# Altium footprint library 4.49-接插件.PcbLib: 260 footprints (part 17 of 17)
Each footprint in its own frame and in the unit in brackets; x right, y up, seen from the top. Pads: shape width x height; smd on the part's side, far side on the other; paste and mask are expansions set on the pad; w line width, h text height; cw(c..) or ccw(c..) is an arc to the next point about the centre after c.
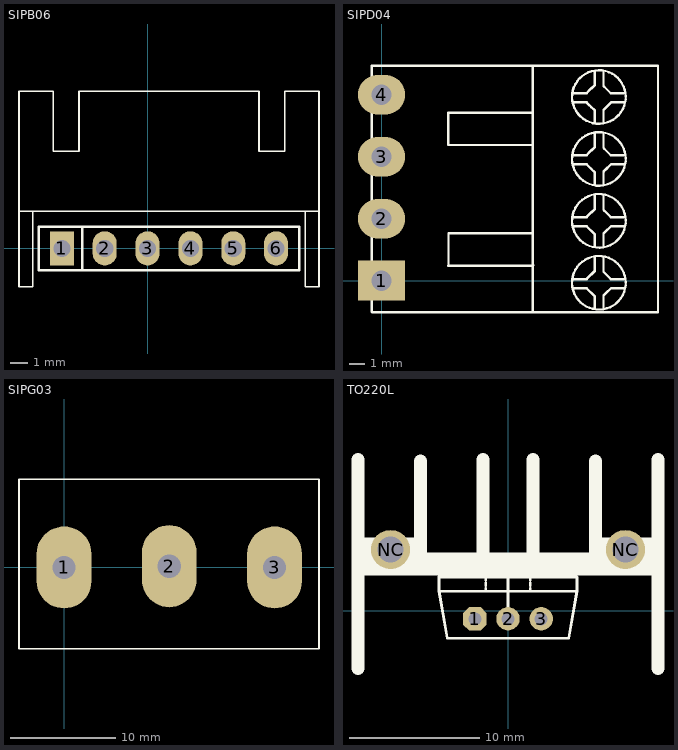
[diagram p16: the footprints below, top view; thin cyan lines are the x and y axes]

## SIPB06 [mm] "[ PCBѧϰȺ514746572 ]"
pads (6):
  rect 1.4x2 hole 1: 1(-5,0)
  oval 1.4x2 hole 1: 2(-2.5,0) 3(0,0) 4(2.5,0) 5(5,0) 6(7.5,0)
Top Overlay:
  lines w0.1: -4,9.164 -4,5.664 -5.5,5.664 -5.5,9.164 -7.5,9.164 -7.5,-2.236 -6.7,-2.236 -6.7,2.164 -7.5,2.164 1.62,2.164 4.27,2.164 ; -4,9.167 6.5,9.167 ; 4.16,2.164 6.81,2.164 ; 6.5,9.164 6.5,5.664 8,5.664 8,9.164 10,9.164 10,-2.236 9.2,-2.236 9.2,2.164 10,2.164 ; 6.66,2.164 9.31,2.164
  lines w0.15: -3.81,-1.27 -3.81,1.27 ; -6.35,-1.27 8.85,-1.27 8.85,1.27 -6.35,1.27 -6.35,-1.27

## SIPD04 [mm] "[ PCBѧϰȺ514746572 ]"
pads (4):
  rect 3x2.54 hole 1.3: 1(0,0)
  oval 3x2.54 hole 1.3: 2(0,3.95) 3(0,7.9) 4(0,11.85)
Top Overlay:
  lines w0.15: 9.613,8.65 4.253,8.65 4.253,10.712 4.249,10.716 9.637,10.716 ; 9.63,3.025 4.27,3.025 4.27,0.963 4.266,0.959 9.654,0.959 9.671,0.976 ; 9.654,-2.019 9.654,13.711 9.637,13.694 ; 9.654,10.699 9.637,10.716 ; 12.168,0.099 13.066,0.099 13.336,0.369 13.606,0.639 13.606,1.495 13.606,0.618 13.087,0.099 ; 12.168,4.049 13.066,4.049 13.336,4.319 13.606,4.589 13.606,5.445 13.606,4.568 13.087,4.049 ; 12.168,7.999 13.066,7.999 13.336,8.269 13.606,8.539 13.606,9.395 13.606,8.518 13.087,7.999 ; 12.168,11.949 13.066,11.949 13.336,12.219 13.606,12.489 13.606,13.345 13.606,12.468 13.087,11.949 ; 12.197,-0.481 13.08,-0.481 ; 12.197,3.469 13.08,3.469 ; 12.197,7.419 13.08,7.419 ; 12.197,11.369 13.08,11.369 ; 13.373,-0.774 13.606,-1.007 13.606,-1.768 ; 13.373,3.176 13.606,2.943 13.606,2.182 ; 13.373,7.126 13.606,6.893 13.606,6.132 ; 13.373,11.076 13.606,10.843 13.606,10.082 ; 13.38,-0.781 13.08,-0.481 ; 13.38,3.169 13.08,3.469 ; 13.38,7.119 13.08,7.419 ; 13.38,11.069 13.08,11.369 ; 13.552,-0.953 13.08,-0.481 ; 13.552,2.997 13.08,3.469 ; 13.552,6.947 13.08,7.419 ; 13.552,10.897 13.08,11.369 ; 14.152,-1.789 14.152,-0.96 14.402,-0.71 ; 14.152,-0.946 14.166,-0.946 14.631,-0.481 ; 14.152,1.461 14.152,0.571 14.206,0.517 ; 14.152,2.161 14.152,2.99 14.402,3.24 ; 14.152,3.004 14.166,3.004 14.631,3.469 ; 14.152,5.411 14.152,4.521 14.206,4.467 ; 14.152,6.111 14.152,6.94 14.402,7.19 ; 14.152,6.954 14.166,6.954 14.631,7.419 ; 14.152,9.361 14.152,8.471 14.206,8.417 ; 14.152,10.061 14.152,10.89 14.402,11.14 ; 14.152,10.904 14.166,10.904 14.631,11.369 ; 14.152,13.311 14.152,12.421 14.206,12.367 ; 14.348,-0.764 14.631,-0.481 ; 14.348,3.186 14.631,3.469 ; 14.348,7.136 14.631,7.419 ; 14.348,11.086 14.631,11.369 ; 15.406,0.099 14.624,0.099 ; 15.406,4.049 14.624,4.049 ; 15.406,7.999 14.624,7.999 ; 15.406,11.949 14.624,11.949 ; 15.515,-0.481 14.631,-0.481 ; 15.515,3.469 14.631,3.469 ; 15.515,7.419 14.631,7.419 ; 15.515,11.369 14.631,11.369 ; 15.565,-0.277 cw(c13.861,-0.136) 15.571,-0.136 ; 15.565,3.673 cw(c13.861,3.814) 15.571,3.814 ; 15.565,7.623 cw(c13.861,7.764) 15.571,7.764 ; 15.565,11.573 cw(c13.861,11.714) 15.571,11.714 ; 17.629,-2.019 13.222,-2.019 1.07,-2.019 -0.009,-2.019 -0.482,-2.019 -0.587,-2.019 -0.629,-1.977 -0.629,13.694 2.115,13.694 9.637,13.694 ; 17.632,-2.022 17.632,13.694 9.637,13.694 ; 9.637,10.716 9.637,13.694 ; 14.206,0.517 14.624,0.099 ; 14.206,0.517 14.624,0.099 ; 14.206,4.467 14.624,4.049 ; 14.206,4.467 14.624,4.049 ; 14.206,8.417 14.624,7.999 ; 14.206,8.417 14.624,7.999 ; 14.206,12.367 14.624,11.949 ; 14.206,12.367 14.624,11.949

## SIPG03 [mm] "[ PCBѧϰȺ514746572 ]"
pads (3):
  oval 5.2x7.8 hole 2.2: 1(0,0) 2(10,0.11) 3(20,0)
Top Overlay:
  lines w0.15: -4.279,-7.739 -4.279,8.381 24.221,8.381 24.221,-7.739 -4.279,-7.739

## TO220L [mm] "[ PCBѧϰȺ514746572 ]"
pads (5):
  oct 1.8x1.8 hole 1: 1(-2.54,-0.6)
  round 1.8 hole 1: 2(0,-0.6) 3(2.54,-0.6)
  round 3 hole 2: NC(-9,4.7) NC(9,4.7)
Top Overlay:
  lines w0.2: -11.5,3.6 -11.5,11.6 ; -5.3,2.6 -0.008,2.6 ; -5.292,2.575 -5.292,1.517 ; -1.693,1.517 -1.693,1.728 ; -1.693,1.94 -1.693,2.152 ; -1.693,2.363 -1.693,2.575 ; 0,-0.6 0,2.6 5.292,2.6 ; 1.693,1.517 1.693,1.728 ; 1.693,1.94 1.693,2.152 ; 1.693,2.363 1.693,2.575 ; 5.292,2.575 5.292,1.517 ; -5.292,1.517 5.292,1.517 ; -5.292,1.517 -4.657,-2.082 4.657,-2.082 5.292,1.517
  lines w0.35: -11.5,2.9 11.4,2.9 ; -11.5,3.1 11.5,3.1 ; -11.5,4.1 11.3,4.1 ; -11.5,4.3 11.5,4.3
  lines w0.7: -11.5,4.8 -6.7,4.8 ; -11.3,5.3 -6.7,5.3 ; 6.7,5.3 11,5.3 ; 6.9,4.8 11.2,4.8
  lines w1: -11.5,-4.4 -11.5,3.6 ; -11.5,11.6 -11.5,3.6 ; -6.7,3.6 -6.7,11.5 ; -1.9,3.6 -1.9,11.6 ; 1.9,3.6 1.9,11.6 ; 6.7,3.6 6.7,11.5 ; 11.5,-4.4 11.5,3.6 ; 11.5,11.6 11.5,3.6 ; -11.5,3.6 11.5,3.6